# Altium integrated library Weidmueller_OMNIMATE_Signal.IntLib: 2550 symbols (part 17 of 45)
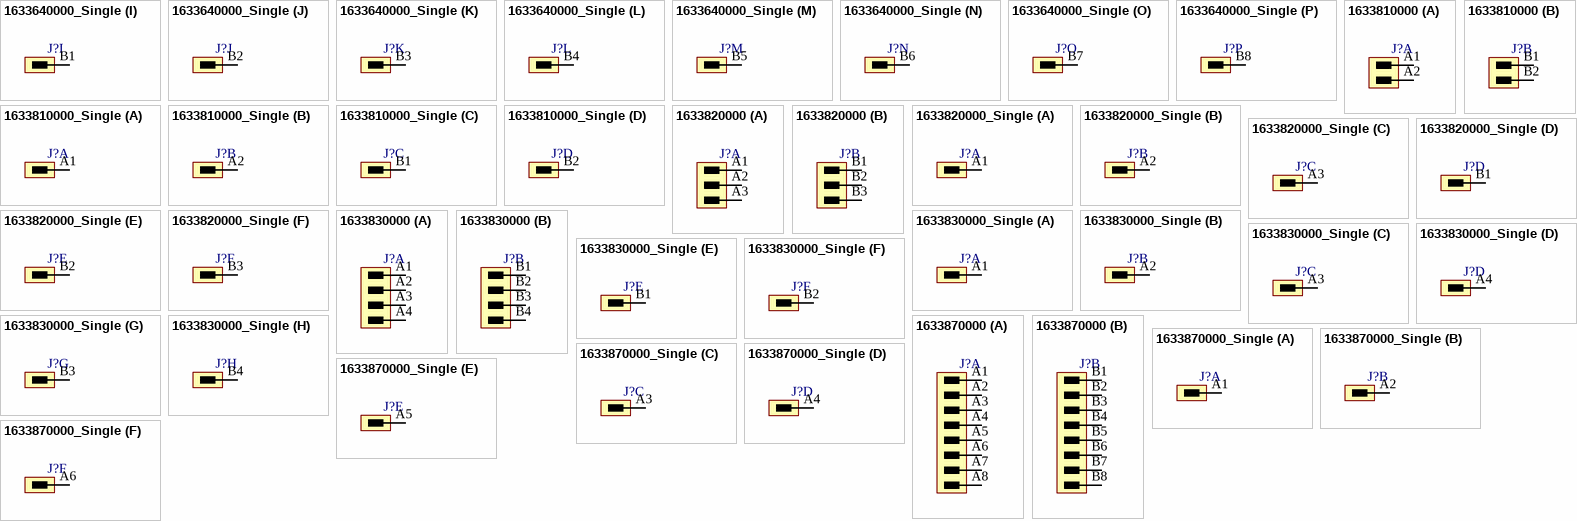
[diagram p227: symbols 1633640000_Single to 1633870000_Single]

## 1633820000_Single
designator J?
OMNIMATE Signal - series BL/SL 3.50; PartNumber: 1633820000; Manufacturer: Weidmueller; Short_text_for_material: SLD 3.50/06/90F 3.2SN OR BX; Side_termination_characteristic: Flange; Mounting_onto_the_PCB: Solder connection; Pitch_mm: 3.5 mm; Pitch_inch: 0.138 inch; No_of_poles: 6; Outgoing_elbow: 90°; Solder_pin_length_mm: 3.2 mm; Contact_material: CuSn; Contact_surface: tinned; Insulating_material: PBT; UL_94_flammability_rating: V-0; Rated_voltage_for_surge_voltage_class_pollution_degree_II_2: 200 V; Rated_current_min_no_of_poles_TU_20_deg_C: 32 A; Rated_voltage_use_group_B_UL_1059: 300 V; Rated_current_use_group_B_UL_1059: 8 A; PackageReference: SLD_3_50_90F_06; Colour: Orange; Packaging: Box; Qty: 50 PCS; Revision: V1; ComponentLink1Description: Manufacturer URL; ComponentLink1URL: http://www.weidmueller.com/; ComponentLink2Description: URL Link1; ComponentLink2URL: http://catalog.weidmueller.com/catalog/Start.do?localeId=en&ObjectID=1633820000
footprint SLD_3_50_90F_06 (OMNIMATE Signal - Serie BL/SL 3.50  SLD 3.50/06/90F 3.2)
part A pins: A1
part B pins: A2
part C pins: A3
part D pins: B1
part E pins: B2
part F pins: B3

## 1633830000
designator J?
OMNIMATE Signal - series BL/SL 3.50; PartNumber: 1633830000; Manufacturer: Weidmueller; Short_text_for_material: SLD 3.50/08/90F 3.2SN OR BX; Side_termination_characteristic: Flange; Mounting_onto_the_PCB: Solder connection; Pitch_mm: 3.5 mm; Pitch_inch: 0.138 inch; No_of_poles: 8; Outgoing_elbow: 90°; Solder_pin_length_mm: 3.2 mm; Contact_material: CuSn; Contact_surface: tinned; Insulating_material: PBT; UL_94_flammability_rating: V-0; Rated_voltage_for_surge_voltage_class_pollution_degree_II_2: 200 V; Rated_current_min_no_of_poles_TU_20_deg_C: 32 A; Rated_voltage_use_group_B_UL_1059: 300 V; Rated_current_use_group_B_UL_1059: 8 A; PackageReference: SLD_3_50_90F_08; Colour: Orange; Packaging: Box; Qty: 50 PCS; Revision: V1; ComponentLink1Description: Manufacturer URL; ComponentLink1URL: http://www.weidmueller.com/; ComponentLink2Description: URL Link1; ComponentLink2URL: http://catalog.weidmueller.com/catalog/Start.do?localeId=en&ObjectID=1633830000
footprint SLD_3_50_90F_08 (OMNIMATE Signal - Serie BL/SL 3.50  SLD 3.50/08/90F 3.2)
part A pins: A1, A2, A3, A4
part B pins: B1, B2, B3, B4

## 1633830000_Single
designator J?
OMNIMATE Signal - series BL/SL 3.50; PartNumber: 1633830000; Manufacturer: Weidmueller; Short_text_for_material: SLD 3.50/08/90F 3.2SN OR BX; Side_termination_characteristic: Flange; Mounting_onto_the_PCB: Solder connection; Pitch_mm: 3.5 mm; Pitch_inch: 0.138 inch; No_of_poles: 8; Outgoing_elbow: 90°; Solder_pin_length_mm: 3.2 mm; Contact_material: CuSn; Contact_surface: tinned; Insulating_material: PBT; UL_94_flammability_rating: V-0; Rated_voltage_for_surge_voltage_class_pollution_degree_II_2: 200 V; Rated_current_min_no_of_poles_TU_20_deg_C: 32 A; Rated_voltage_use_group_B_UL_1059: 300 V; Rated_current_use_group_B_UL_1059: 8 A; PackageReference: SLD_3_50_90F_08; Colour: Orange; Packaging: Box; Qty: 50 PCS; Revision: V1; ComponentLink1Description: Manufacturer URL; ComponentLink1URL: http://www.weidmueller.com/; ComponentLink2Description: URL Link1; ComponentLink2URL: http://catalog.weidmueller.com/catalog/Start.do?localeId=en&ObjectID=1633830000
footprint SLD_3_50_90F_08 (OMNIMATE Signal - Serie BL/SL 3.50  SLD 3.50/08/90F 3.2)
part A pins: A1
part B pins: A2
part C pins: A3
part D pins: A4
part E pins: B1
part F pins: B2
part G pins: B3
part H pins: B4

## 1633870000
designator J?
OMNIMATE Signal - series BL/SL 3.50; PartNumber: 1633870000; Manufacturer: Weidmueller; Short_text_for_material: SLD 3.50/16/90F 3.2SN OR BX; Side_termination_characteristic: Flange; Mounting_onto_the_PCB: Solder connection; Pitch_mm: 3.5 mm; Pitch_inch: 0.138 inch; No_of_poles: 16; Outgoing_elbow: 90°; Solder_pin_length_mm: 3.2 mm; Contact_material: CuSn; Contact_surface: tinned; Insulating_material: PBT; UL_94_flammability_rating: V-0; Rated_voltage_for_surge_voltage_class_pollution_degree_II_2: 200 V; Rated_current_min_no_of_poles_TU_20_deg_C: 32 A; Rated_voltage_use_group_B_UL_1059: 300 V; Rated_current_use_group_B_UL_1059: 8 A; PackageReference: SLD_3_50_90F_16; Colour: Orange; Packaging: Box; Qty: 20 PCS; Revision: V1; ComponentLink1Description: Manufacturer URL; ComponentLink1URL: http://www.weidmueller.com/; ComponentLink2Description: URL Link1; ComponentLink2URL: http://catalog.weidmueller.com/catalog/Start.do?localeId=en&ObjectID=1633870000
footprint SLD_3_50_90F_16 (OMNIMATE Signal - Serie BL/SL 3.50  SLD 3.50/16/90F 3.2)
part A pins: A1, A2, A3, A4, A5, A6, A7, A8
part B pins: B1, B2, B3, B4, B5, B6, B7, B8

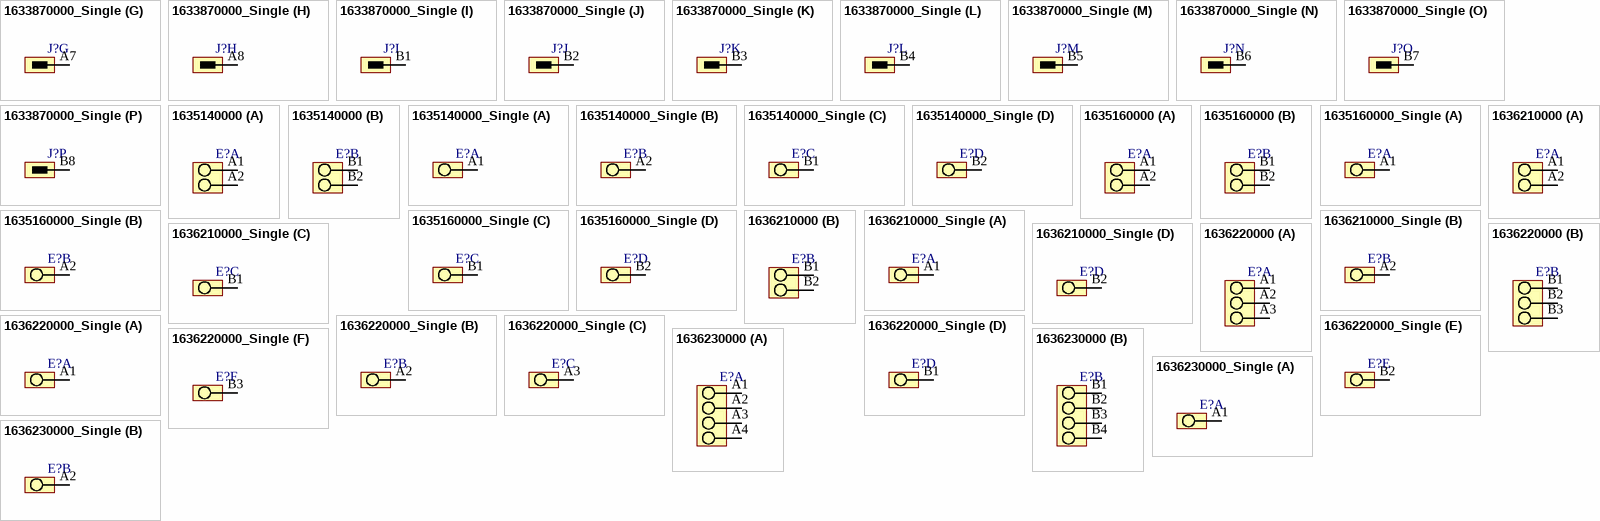
[diagram p92: symbols 1633870000_Single to 1636230000_Single]

## 1633870000_Single
designator J?
OMNIMATE Signal - series BL/SL 3.50; PartNumber: 1633870000; Manufacturer: Weidmueller; Short_text_for_material: SLD 3.50/16/90F 3.2SN OR BX; Side_termination_characteristic: Flange; Mounting_onto_the_PCB: Solder connection; Pitch_mm: 3.5 mm; Pitch_inch: 0.138 inch; No_of_poles: 16; Outgoing_elbow: 90°; Solder_pin_length_mm: 3.2 mm; Contact_material: CuSn; Contact_surface: tinned; Insulating_material: PBT; UL_94_flammability_rating: V-0; Rated_voltage_for_surge_voltage_class_pollution_degree_II_2: 200 V; Rated_current_min_no_of_poles_TU_20_deg_C: 32 A; Rated_voltage_use_group_B_UL_1059: 300 V; Rated_current_use_group_B_UL_1059: 8 A; PackageReference: SLD_3_50_90F_16; Colour: Orange; Packaging: Box; Qty: 20 PCS; Revision: V1; ComponentLink1Description: Manufacturer URL; ComponentLink1URL: http://www.weidmueller.com/; ComponentLink2Description: URL Link1; ComponentLink2URL: http://catalog.weidmueller.com/catalog/Start.do?localeId=en&ObjectID=1633870000
footprint SLD_3_50_90F_16 (OMNIMATE Signal - Serie BL/SL 3.50  SLD 3.50/16/90F 3.2)
part A pins: A1
part B pins: A2
part C pins: A3
part D pins: A4
part E pins: A5
part F pins: A6
part G pins: A7
part H pins: A8
part I pins: B1
part J pins: B2
part K pins: B3
part L pins: B4
part M pins: B5
part N pins: B6
part O pins: B7
part P pins: B8

## 1635140000
designator E?
OMNIMATE Signal - series LP; PartNumber: 1635140000; Manufacturer: Weidmueller; Short_text_for_material: LP2N 5.08/04/90 3.2SN OR BX; Side_termination_characteristic: closed side; Mounting_onto_the_PCB: Solder connection; Pitch_mm: 5,08 mm; Pitch_inch: 0,2 inch; No_of_poles: 4; Solder_pin_length_mm: 3,2 mm; Contact_material: Cu-Leg; Contact_surface: tinned; Insulating_material: PA; UL_94_flammability_rating: V-2; Rated_voltage_for_surge_voltage_class_pollution_degree_II_2: 500 V; Rated_current_min_no_of_poles_TU_20_deg_C: 32 A; Solid_min_H05_07_V_U: 0,5 mm²; Solid_max_H05_07_V_U: 6 mm²; Rated_voltage_use_group_B_UL_1059: 300 V; Rated_current_use_group_B_UL_1059: 20 A; Wire_cross_section_AWG_min_UL_1059: AWG 26; Wire_cross_section_AWG_max_UL_1059: AWG 12; PackageReference: LP2N_5_08_04; Colour: Orange; Packaging: Box; Qty: 50 PCS; Revision: V1; ComponentLink1Description: Manufacturer URL; ComponentLink1URL: http://www.weidmueller.com/; ComponentLink2Description: URL Link1; ComponentLink2URL: http://catalog.weidmueller.com/catalog/Start.do?localeId=en&ObjectID=1635140000
footprint LP2N_5_08_04 (OMNIMATE Signal - Serie LP  LP2N 5.08/04/90 3.2)
part A pins: A1, A2
part B pins: B1, B2
1 alternate drawing of the same symbol

## 1635140000_Single
designator E?
OMNIMATE Signal - series LP; PartNumber: 1635140000; Manufacturer: Weidmueller; Short_text_for_material: LP2N 5.08/04/90 3.2SN OR BX; Side_termination_characteristic: closed side; Mounting_onto_the_PCB: Solder connection; Pitch_mm: 5,08 mm; Pitch_inch: 0,2 inch; No_of_poles: 4; Solder_pin_length_mm: 3,2 mm; Contact_material: Cu-Leg; Contact_surface: tinned; Insulating_material: PA; UL_94_flammability_rating: V-2; Rated_voltage_for_surge_voltage_class_pollution_degree_II_2: 500 V; Rated_current_min_no_of_poles_TU_20_deg_C: 32 A; Solid_min_H05_07_V_U: 0,5 mm²; Solid_max_H05_07_V_U: 6 mm²; Rated_voltage_use_group_B_UL_1059: 300 V; Rated_current_use_group_B_UL_1059: 20 A; Wire_cross_section_AWG_min_UL_1059: AWG 26; Wire_cross_section_AWG_max_UL_1059: AWG 12; PackageReference: LP2N_5_08_04; Colour: Orange; Packaging: Box; Qty: 50 PCS; Revision: V1; ComponentLink1Description: Manufacturer URL; ComponentLink1URL: http://www.weidmueller.com/; ComponentLink2Description: URL Link1; ComponentLink2URL: http://catalog.weidmueller.com/catalog/Start.do?localeId=en&ObjectID=1635140000
footprint LP2N_5_08_04 (OMNIMATE Signal - Serie LP  LP2N 5.08/04/90 3.2)
part A pins: A1
part B pins: A2
part C pins: B1
part D pins: B2
1 alternate drawing of the same symbol

## 1635160000
designator E?
OMNIMATE Signal - series LP; PartNumber: 1635160000; Manufacturer: Weidmueller; Short_text_for_material: LP2N 5.00/04/90 3.2SN OR BX; Side_termination_characteristic: closed side; Mounting_onto_the_PCB: Solder connection; Pitch_mm: 5 mm; Pitch_inch: 0,197 inch; No_of_poles: 4; Solder_pin_length_mm: 3,2 mm; Contact_material: Cu-Leg; Contact_surface: tinned; Insulating_material: PA; UL_94_flammability_rating: V-2; Rated_voltage_for_surge_voltage_class_pollution_degree_II_2: 500 V; Rated_current_min_no_of_poles_TU_20_deg_C: 32 A; Solid_min_H05_07_V_U: 0,5 mm²; Solid_max_H05_07_V_U: 6 mm²; Rated_voltage_use_group_B_UL_1059: 300 V; Rated_current_use_group_B_UL_1059: 20 A; Wire_cross_section_AWG_min_UL_1059: AWG 26; Wire_cross_section_AWG_max_UL_1059: AWG 12; PackageReference: LP2N_5_00_04; Colour: Orange; Packaging: Box; Qty: 50 PCS; Revision: V1; ComponentLink1Description: Manufacturer URL; ComponentLink1URL: http://www.weidmueller.com/; ComponentLink2Description: URL Link1; ComponentLink2URL: http://catalog.weidmueller.com/catalog/Start.do?localeId=en&ObjectID=1635160000
footprint LP2N_5_00_04 (OMNIMATE Signal - Serie LP  LP2N 5.00/04/90 3.2)
part A pins: A1, A2
part B pins: B1, B2
1 alternate drawing of the same symbol

## 1635160000_Single
designator E?
OMNIMATE Signal - series LP; PartNumber: 1635160000; Manufacturer: Weidmueller; Short_text_for_material: LP2N 5.00/04/90 3.2SN OR BX; Side_termination_characteristic: closed side; Mounting_onto_the_PCB: Solder connection; Pitch_mm: 5 mm; Pitch_inch: 0,197 inch; No_of_poles: 4; Solder_pin_length_mm: 3,2 mm; Contact_material: Cu-Leg; Contact_surface: tinned; Insulating_material: PA; UL_94_flammability_rating: V-2; Rated_voltage_for_surge_voltage_class_pollution_degree_II_2: 500 V; Rated_current_min_no_of_poles_TU_20_deg_C: 32 A; Solid_min_H05_07_V_U: 0,5 mm²; Solid_max_H05_07_V_U: 6 mm²; Rated_voltage_use_group_B_UL_1059: 300 V; Rated_current_use_group_B_UL_1059: 20 A; Wire_cross_section_AWG_min_UL_1059: AWG 26; Wire_cross_section_AWG_max_UL_1059: AWG 12; PackageReference: LP2N_5_00_04; Colour: Orange; Packaging: Box; Qty: 50 PCS; Revision: V1; ComponentLink1Description: Manufacturer URL; ComponentLink1URL: http://www.weidmueller.com/; ComponentLink2Description: URL Link1; ComponentLink2URL: http://catalog.weidmueller.com/catalog/Start.do?localeId=en&ObjectID=1635160000
footprint LP2N_5_00_04 (OMNIMATE Signal - Serie LP  LP2N 5.00/04/90 3.2)
part A pins: A1
part B pins: A2
part C pins: B1
part D pins: B2
1 alternate drawing of the same symbol

## 1636210000
designator E?
OMNIMATE Signal - series LP; PartNumber: 1636210000; Manufacturer: Weidmueller; Short_text_for_material: LP2HR 5.08/04/90 3.2SN OR BX; Side_termination_characteristic: closed side; Mounting_onto_the_PCB: Solder connection; Pitch_mm: 5,08 mm; Pitch_inch: 0,2 inch; No_of_poles: 4; Solder_pin_length_mm: 3,2 mm; Contact_material: Cu-Leg; Contact_surface: tinned; Insulating_material: PA; UL_94_flammability_rating: V-2; Rated_voltage_for_surge_voltage_class_pollution_degree_II_2: 500 V; Rated_current_min_no_of_poles_TU_20_deg_C: 32 A; Solid_min_H05_07_V_U: 0,5 mm²; Solid_max_H05_07_V_U: 6 mm²; Rated_voltage_use_group_B_UL_1059: 300 V; Rated_current_use_group_B_UL_1059: 20 A; Wire_cross_section_AWG_min_UL_1059: AWG 26; Wire_cross_section_AWG_max_UL_1059: AWG 12; PackageReference: LP2HR_5_08_04; Colour: Orange; Packaging: Box; Qty: 50 PCS; Revision: V1; ComponentLink1Description: Manufacturer URL; ComponentLink1URL: http://www.weidmueller.com/; ComponentLink2Description: URL Link1; ComponentLink2URL: http://catalog.weidmueller.com/catalog/Start.do?localeId=en&ObjectID=1636210000
footprint LP2HR_5_08_04 (OMNIMATE Signal - Serie LP  LP2HR 5.08/04/90 3.2)
part A pins: A1, A2
part B pins: B1, B2
1 alternate drawing of the same symbol

## 1636210000_Single
designator E?
OMNIMATE Signal - series LP; PartNumber: 1636210000; Manufacturer: Weidmueller; Short_text_for_material: LP2HR 5.08/04/90 3.2SN OR BX; Side_termination_characteristic: closed side; Mounting_onto_the_PCB: Solder connection; Pitch_mm: 5,08 mm; Pitch_inch: 0,2 inch; No_of_poles: 4; Solder_pin_length_mm: 3,2 mm; Contact_material: Cu-Leg; Contact_surface: tinned; Insulating_material: PA; UL_94_flammability_rating: V-2; Rated_voltage_for_surge_voltage_class_pollution_degree_II_2: 500 V; Rated_current_min_no_of_poles_TU_20_deg_C: 32 A; Solid_min_H05_07_V_U: 0,5 mm²; Solid_max_H05_07_V_U: 6 mm²; Rated_voltage_use_group_B_UL_1059: 300 V; Rated_current_use_group_B_UL_1059: 20 A; Wire_cross_section_AWG_min_UL_1059: AWG 26; Wire_cross_section_AWG_max_UL_1059: AWG 12; PackageReference: LP2HR_5_08_04; Colour: Orange; Packaging: Box; Qty: 50 PCS; Revision: V1; ComponentLink1Description: Manufacturer URL; ComponentLink1URL: http://www.weidmueller.com/; ComponentLink2Description: URL Link1; ComponentLink2URL: http://catalog.weidmueller.com/catalog/Start.do?localeId=en&ObjectID=1636210000
footprint LP2HR_5_08_04 (OMNIMATE Signal - Serie LP  LP2HR 5.08/04/90 3.2)
part A pins: A1
part B pins: A2
part C pins: B1
part D pins: B2
1 alternate drawing of the same symbol

## 1636220000
designator E?
OMNIMATE Signal - series LP; PartNumber: 1636220000; Manufacturer: Weidmueller; Short_text_for_material: LP2HR 5.08/06/90 3.2SN OR BX; Side_termination_characteristic: closed side; Mounting_onto_the_PCB: Solder connection; Pitch_mm: 5,08 mm; Pitch_inch: 0,2 inch; No_of_poles: 6; Solder_pin_length_mm: 3,2 mm; Contact_material: Cu-Leg; Contact_surface: tinned; Insulating_material: PA; UL_94_flammability_rating: V-2; Rated_voltage_for_surge_voltage_class_pollution_degree_II_2: 500 V; Rated_current_min_no_of_poles_TU_20_deg_C: 32 A; Solid_min_H05_07_V_U: 0,5 mm²; Solid_max_H05_07_V_U: 6 mm²; Rated_voltage_use_group_B_UL_1059: 300 V; Rated_current_use_group_B_UL_1059: 20 A; Wire_cross_section_AWG_min_UL_1059: AWG 26; Wire_cross_section_AWG_max_UL_1059: AWG 12; PackageReference: LP2HR_5_08_06; Colour: Orange; Packaging: Box; Qty: 50 PCS; Revision: V1; ComponentLink1Description: Manufacturer URL; ComponentLink1URL: http://www.weidmueller.com/; ComponentLink2Description: URL Link1; ComponentLink2URL: http://catalog.weidmueller.com/catalog/Start.do?localeId=en&ObjectID=1636220000
footprint LP2HR_5_08_06 (OMNIMATE Signal - Serie LP  LP2HR 5.08/06/90 3.2)
part A pins: A1, A2, A3
part B pins: B1, B2, B3
1 alternate drawing of the same symbol

## 1636220000_Single
designator E?
OMNIMATE Signal - series LP; PartNumber: 1636220000; Manufacturer: Weidmueller; Short_text_for_material: LP2HR 5.08/06/90 3.2SN OR BX; Side_termination_characteristic: closed side; Mounting_onto_the_PCB: Solder connection; Pitch_mm: 5,08 mm; Pitch_inch: 0,2 inch; No_of_poles: 6; Solder_pin_length_mm: 3,2 mm; Contact_material: Cu-Leg; Contact_surface: tinned; Insulating_material: PA; UL_94_flammability_rating: V-2; Rated_voltage_for_surge_voltage_class_pollution_degree_II_2: 500 V; Rated_current_min_no_of_poles_TU_20_deg_C: 32 A; Solid_min_H05_07_V_U: 0,5 mm²; Solid_max_H05_07_V_U: 6 mm²; Rated_voltage_use_group_B_UL_1059: 300 V; Rated_current_use_group_B_UL_1059: 20 A; Wire_cross_section_AWG_min_UL_1059: AWG 26; Wire_cross_section_AWG_max_UL_1059: AWG 12; PackageReference: LP2HR_5_08_06; Colour: Orange; Packaging: Box; Qty: 50 PCS; Revision: V1; ComponentLink1Description: Manufacturer URL; ComponentLink1URL: http://www.weidmueller.com/; ComponentLink2Description: URL Link1; ComponentLink2URL: http://catalog.weidmueller.com/catalog/Start.do?localeId=en&ObjectID=1636220000
footprint LP2HR_5_08_06 (OMNIMATE Signal - Serie LP  LP2HR 5.08/06/90 3.2)
part A pins: A1
part B pins: A2
part C pins: A3
part D pins: B1
part E pins: B2
part F pins: B3
1 alternate drawing of the same symbol

## 1636230000
designator E?
OMNIMATE Signal - series LP; PartNumber: 1636230000; Manufacturer: Weidmueller; Short_text_for_material: LP2HR 5.08/08/90 3.2SN OR BX; Side_termination_characteristic: closed side; Mounting_onto_the_PCB: Solder connection; Pitch_mm: 5,08 mm; Pitch_inch: 0,2 inch; No_of_poles: 8; Solder_pin_length_mm: 3,2 mm; Contact_material: Cu-Leg; Contact_surface: tinned; Insulating_material: PA; UL_94_flammability_rating: V-2; Rated_voltage_for_surge_voltage_class_pollution_degree_II_2: 500 V; Rated_current_min_no_of_poles_TU_20_deg_C: 32 A; Solid_min_H05_07_V_U: 0,5 mm²; Solid_max_H05_07_V_U: 6 mm²; Rated_voltage_use_group_B_UL_1059: 300 V; Rated_current_use_group_B_UL_1059: 20 A; Wire_cross_section_AWG_min_UL_1059: AWG 26; Wire_cross_section_AWG_max_UL_1059: AWG 12; PackageReference: LP2HR_5_08_08; Colour: Orange; Packaging: Box; Qty: 50 PCS; Revision: V1; ComponentLink1Description: Manufacturer URL; ComponentLink1URL: http://www.weidmueller.com/; ComponentLink2Description: URL Link1; ComponentLink2URL: http://catalog.weidmueller.com/catalog/Start.do?localeId=en&ObjectID=1636230000
footprint LP2HR_5_08_08 (OMNIMATE Signal - Serie LP  LP2HR 5.08/08/90 3.2)
part A pins: A1, A2, A3, A4
part B pins: B1, B2, B3, B4
1 alternate drawing of the same symbol

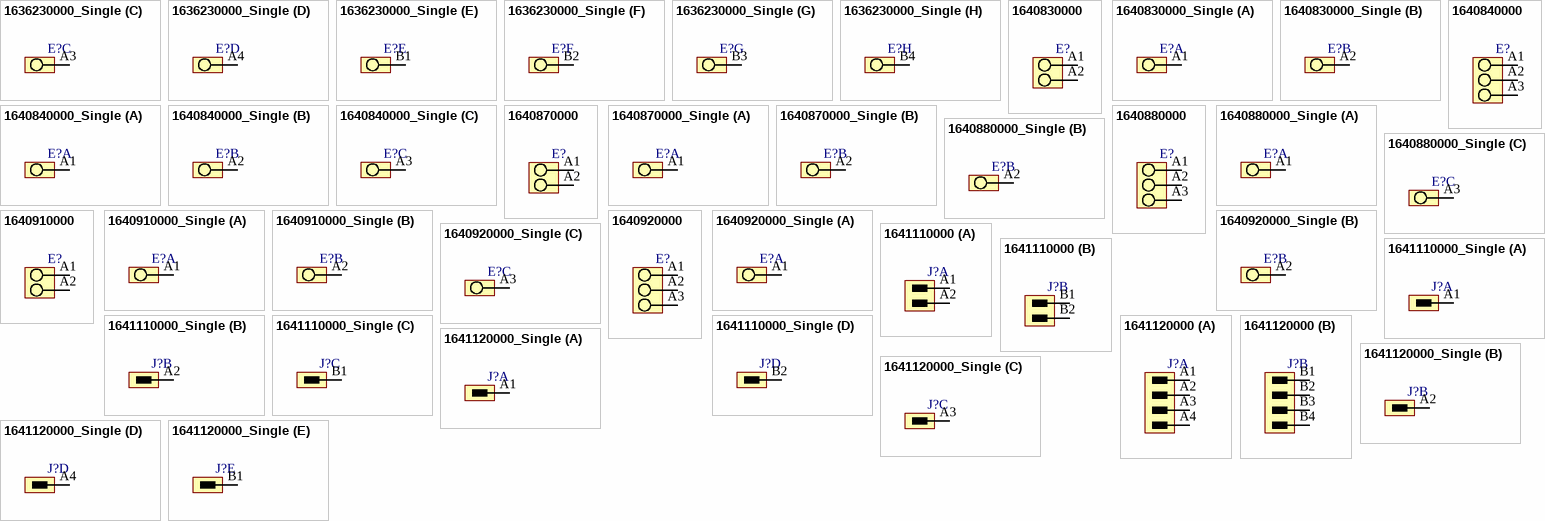
[diagram p93: symbols 1636230000_Single to 1641120000_Single]

## 1636230000_Single
designator E?
OMNIMATE Signal - series LP; PartNumber: 1636230000; Manufacturer: Weidmueller; Short_text_for_material: LP2HR 5.08/08/90 3.2SN OR BX; Side_termination_characteristic: closed side; Mounting_onto_the_PCB: Solder connection; Pitch_mm: 5,08 mm; Pitch_inch: 0,2 inch; No_of_poles: 8; Solder_pin_length_mm: 3,2 mm; Contact_material: Cu-Leg; Contact_surface: tinned; Insulating_material: PA; UL_94_flammability_rating: V-2; Rated_voltage_for_surge_voltage_class_pollution_degree_II_2: 500 V; Rated_current_min_no_of_poles_TU_20_deg_C: 32 A; Solid_min_H05_07_V_U: 0,5 mm²; Solid_max_H05_07_V_U: 6 mm²; Rated_voltage_use_group_B_UL_1059: 300 V; Rated_current_use_group_B_UL_1059: 20 A; Wire_cross_section_AWG_min_UL_1059: AWG 26; Wire_cross_section_AWG_max_UL_1059: AWG 12; PackageReference: LP2HR_5_08_08; Colour: Orange; Packaging: Box; Qty: 50 PCS; Revision: V1; ComponentLink1Description: Manufacturer URL; ComponentLink1URL: http://www.weidmueller.com/; ComponentLink2Description: URL Link1; ComponentLink2URL: http://catalog.weidmueller.com/catalog/Start.do?localeId=en&ObjectID=1636230000
footprint LP2HR_5_08_08 (OMNIMATE Signal - Serie LP  LP2HR 5.08/08/90 3.2)
part A pins: A1
part B pins: A2
part C pins: A3
part D pins: A4
part E pins: B1
part F pins: B2
part G pins: B3
part H pins: B4
1 alternate drawing of the same symbol

## 1640830000
designator E?
OMNIMATE Signal - series LP; PartNumber: 1640830000; Manufacturer: Weidmueller; Short_text_for_material: LP1N 5.08/02/90 3.2SN OR BX; Side_termination_characteristic: closed side; Mounting_onto_the_PCB: Solder connection; Pitch_mm: 5,08 mm; Pitch_inch: 0,2 inch; No_of_poles: 2; Solder_pin_length_mm: 3,2 mm; Contact_material: Cu-Leg; Contact_surface: tinned; Insulating_material: PA; UL_94_flammability_rating: V-2; Rated_voltage_for_surge_voltage_class_pollution_degree_II_2: 500 V; Rated_current_min_no_of_poles_TU_20_deg_C: 32 A; Solid_min_H05_07_V_U: 0,5 mm²; Solid_max_H05_07_V_U: 6 mm²; Rated_voltage_use_group_B_UL_1059: 300 V; Rated_current_use_group_B_UL_1059: 20 A; Wire_cross_section_AWG_min_UL_1059: AWG 26; Wire_cross_section_AWG_max_UL_1059: AWG 12; PackageReference: LP1N_5_08_02; Colour: Orange; Packaging: Box; Qty: 100 PCS; Revision: V1; ComponentLink1Description: Manufacturer URL; ComponentLink1URL: http://www.weidmueller.com/; ComponentLink2Description: URL Link1; ComponentLink2URL: http://catalog.weidmueller.com/catalog/Start.do?localeId=en&ObjectID=1640830000
footprint LP1N_5_08_02 (OMNIMATE Signal - Serie LP  LP1N 5.08/02/90 3.2)
pins: A1, A2
1 alternate drawing of the same symbol

## 1640830000_Single
designator E?
OMNIMATE Signal - series LP; PartNumber: 1640830000; Manufacturer: Weidmueller; Short_text_for_material: LP1N 5.08/02/90 3.2SN OR BX; Side_termination_characteristic: closed side; Mounting_onto_the_PCB: Solder connection; Pitch_mm: 5,08 mm; Pitch_inch: 0,2 inch; No_of_poles: 2; Solder_pin_length_mm: 3,2 mm; Contact_material: Cu-Leg; Contact_surface: tinned; Insulating_material: PA; UL_94_flammability_rating: V-2; Rated_voltage_for_surge_voltage_class_pollution_degree_II_2: 500 V; Rated_current_min_no_of_poles_TU_20_deg_C: 32 A; Solid_min_H05_07_V_U: 0,5 mm²; Solid_max_H05_07_V_U: 6 mm²; Rated_voltage_use_group_B_UL_1059: 300 V; Rated_current_use_group_B_UL_1059: 20 A; Wire_cross_section_AWG_min_UL_1059: AWG 26; Wire_cross_section_AWG_max_UL_1059: AWG 12; PackageReference: LP1N_5_08_02; Colour: Orange; Packaging: Box; Qty: 100 PCS; Revision: V1; ComponentLink1Description: Manufacturer URL; ComponentLink1URL: http://www.weidmueller.com/; ComponentLink2Description: URL Link1; ComponentLink2URL: http://catalog.weidmueller.com/catalog/Start.do?localeId=en&ObjectID=1640830000
footprint LP1N_5_08_02 (OMNIMATE Signal - Serie LP  LP1N 5.08/02/90 3.2)
part A pins: A1
part B pins: A2
1 alternate drawing of the same symbol

## 1640840000
designator E?
OMNIMATE Signal - series LP; PartNumber: 1640840000; Manufacturer: Weidmueller; Short_text_for_material: LP1N 5.08/03/90 3.2SN OR BX; Side_termination_characteristic: closed side; Mounting_onto_the_PCB: Solder connection; Pitch_mm: 5,08 mm; Pitch_inch: 0,2 inch; No_of_poles: 3; Solder_pin_length_mm: 3,2 mm; Contact_material: Cu-Leg; Contact_surface: tinned; Insulating_material: PA; UL_94_flammability_rating: V-2; Rated_voltage_for_surge_voltage_class_pollution_degree_II_2: 500 V; Rated_current_min_no_of_poles_TU_20_deg_C: 32 A; Solid_min_H05_07_V_U: 0,5 mm²; Solid_max_H05_07_V_U: 6 mm²; Rated_voltage_use_group_B_UL_1059: 300 V; Rated_current_use_group_B_UL_1059: 20 A; Wire_cross_section_AWG_min_UL_1059: AWG 26; Wire_cross_section_AWG_max_UL_1059: AWG 12; PackageReference: LP1N_5_08_03; Colour: Orange; Packaging: Box; Qty: 100 PCS; Revision: V1; ComponentLink1Description: Manufacturer URL; ComponentLink1URL: http://www.weidmueller.com/; ComponentLink2Description: URL Link1; ComponentLink2URL: http://catalog.weidmueller.com/catalog/Start.do?localeId=en&ObjectID=1640840000
footprint LP1N_5_08_03 (OMNIMATE Signal - Serie LP  LP1N 5.08/03/90 3.2)
pins: A1, A2, A3
1 alternate drawing of the same symbol

## 1640840000_Single
designator E?
OMNIMATE Signal - series LP; PartNumber: 1640840000; Manufacturer: Weidmueller; Short_text_for_material: LP1N 5.08/03/90 3.2SN OR BX; Side_termination_characteristic: closed side; Mounting_onto_the_PCB: Solder connection; Pitch_mm: 5,08 mm; Pitch_inch: 0,2 inch; No_of_poles: 3; Solder_pin_length_mm: 3,2 mm; Contact_material: Cu-Leg; Contact_surface: tinned; Insulating_material: PA; UL_94_flammability_rating: V-2; Rated_voltage_for_surge_voltage_class_pollution_degree_II_2: 500 V; Rated_current_min_no_of_poles_TU_20_deg_C: 32 A; Solid_min_H05_07_V_U: 0,5 mm²; Solid_max_H05_07_V_U: 6 mm²; Rated_voltage_use_group_B_UL_1059: 300 V; Rated_current_use_group_B_UL_1059: 20 A; Wire_cross_section_AWG_min_UL_1059: AWG 26; Wire_cross_section_AWG_max_UL_1059: AWG 12; PackageReference: LP1N_5_08_03; Colour: Orange; Packaging: Box; Qty: 100 PCS; Revision: V1; ComponentLink1Description: Manufacturer URL; ComponentLink1URL: http://www.weidmueller.com/; ComponentLink2Description: URL Link1; ComponentLink2URL: http://catalog.weidmueller.com/catalog/Start.do?localeId=en&ObjectID=1640840000
footprint LP1N_5_08_03 (OMNIMATE Signal - Serie LP  LP1N 5.08/03/90 3.2)
part A pins: A1
part B pins: A2
part C pins: A3
1 alternate drawing of the same symbol

## 1640870000
designator E?
OMNIMATE Signal - series LP; PartNumber: 1640870000; Manufacturer: Weidmueller; Short_text_for_material: LP1N 5.00/02/90 3.2SN OR BX; Side_termination_characteristic: closed side; Mounting_onto_the_PCB: Solder connection; Pitch_mm: 5 mm; Pitch_inch: 0,197 inch; No_of_poles: 2; Solder_pin_length_mm: 3,2 mm; Contact_material: Cu-Leg; Contact_surface: tinned; Insulating_material: PA; UL_94_flammability_rating: V-2; Rated_voltage_for_surge_voltage_class_pollution_degree_II_2: 500 V; Rated_current_min_no_of_poles_TU_20_deg_C: 32 A; Solid_min_H05_07_V_U: 0,5 mm²; Solid_max_H05_07_V_U: 6 mm²; Rated_voltage_use_group_B_UL_1059: 300 V; Rated_current_use_group_B_UL_1059: 20 A; Wire_cross_section_AWG_min_UL_1059: AWG 26; Wire_cross_section_AWG_max_UL_1059: AWG 12; PackageReference: LP1N_5_00_02; Colour: Orange; Packaging: Box; Qty: 100 PCS; Revision: V1; ComponentLink1Description: Manufacturer URL; ComponentLink1URL: http://www.weidmueller.com/; ComponentLink2Description: URL Link1; ComponentLink2URL: http://catalog.weidmueller.com/catalog/Start.do?localeId=en&ObjectID=1640870000
footprint LP1N_5_00_02 (OMNIMATE Signal - Serie LP  LP1N 5.00/02/90 3.2)
pins: A1, A2
1 alternate drawing of the same symbol

## 1640870000_Single
designator E?
OMNIMATE Signal - series LP; PartNumber: 1640870000; Manufacturer: Weidmueller; Short_text_for_material: LP1N 5.00/02/90 3.2SN OR BX; Side_termination_characteristic: closed side; Mounting_onto_the_PCB: Solder connection; Pitch_mm: 5 mm; Pitch_inch: 0,197 inch; No_of_poles: 2; Solder_pin_length_mm: 3,2 mm; Contact_material: Cu-Leg; Contact_surface: tinned; Insulating_material: PA; UL_94_flammability_rating: V-2; Rated_voltage_for_surge_voltage_class_pollution_degree_II_2: 500 V; Rated_current_min_no_of_poles_TU_20_deg_C: 32 A; Solid_min_H05_07_V_U: 0,5 mm²; Solid_max_H05_07_V_U: 6 mm²; Rated_voltage_use_group_B_UL_1059: 300 V; Rated_current_use_group_B_UL_1059: 20 A; Wire_cross_section_AWG_min_UL_1059: AWG 26; Wire_cross_section_AWG_max_UL_1059: AWG 12; PackageReference: LP1N_5_00_02; Colour: Orange; Packaging: Box; Qty: 100 PCS; Revision: V1; ComponentLink1Description: Manufacturer URL; ComponentLink1URL: http://www.weidmueller.com/; ComponentLink2Description: URL Link1; ComponentLink2URL: http://catalog.weidmueller.com/catalog/Start.do?localeId=en&ObjectID=1640870000
footprint LP1N_5_00_02 (OMNIMATE Signal - Serie LP  LP1N 5.00/02/90 3.2)
part A pins: A1
part B pins: A2
1 alternate drawing of the same symbol

## 1640880000
designator E?
OMNIMATE Signal - series LP; PartNumber: 1640880000; Manufacturer: Weidmueller; Short_text_for_material: LP1N 5.00/03/90 3.2SN OR BX; Side_termination_characteristic: closed side; Mounting_onto_the_PCB: Solder connection; Pitch_mm: 5 mm; Pitch_inch: 0,197 inch; No_of_poles: 3; Solder_pin_length_mm: 3,2 mm; Contact_material: Cu-Leg; Contact_surface: tinned; Insulating_material: PA; UL_94_flammability_rating: V-2; Rated_voltage_for_surge_voltage_class_pollution_degree_II_2: 500 V; Rated_current_min_no_of_poles_TU_20_deg_C: 32 A; Solid_min_H05_07_V_U: 0,5 mm²; Solid_max_H05_07_V_U: 6 mm²; Rated_voltage_use_group_B_UL_1059: 300 V; Rated_current_use_group_B_UL_1059: 20 A; Wire_cross_section_AWG_min_UL_1059: AWG 26; Wire_cross_section_AWG_max_UL_1059: AWG 12; PackageReference: LP1N_5_00_03; Colour: Orange; Packaging: Box; Qty: 100 PCS; Revision: V1; ComponentLink1Description: Manufacturer URL; ComponentLink1URL: http://www.weidmueller.com/; ComponentLink2Description: URL Link1; ComponentLink2URL: http://catalog.weidmueller.com/catalog/Start.do?localeId=en&ObjectID=1640880000
footprint LP1N_5_00_03 (OMNIMATE Signal - Serie LP  LP1N 5.00/03/90 3.2)
pins: A1, A2, A3
1 alternate drawing of the same symbol

## 1640880000_Single
designator E?
OMNIMATE Signal - series LP; PartNumber: 1640880000; Manufacturer: Weidmueller; Short_text_for_material: LP1N 5.00/03/90 3.2SN OR BX; Side_termination_characteristic: closed side; Mounting_onto_the_PCB: Solder connection; Pitch_mm: 5 mm; Pitch_inch: 0,197 inch; No_of_poles: 3; Solder_pin_length_mm: 3,2 mm; Contact_material: Cu-Leg; Contact_surface: tinned; Insulating_material: PA; UL_94_flammability_rating: V-2; Rated_voltage_for_surge_voltage_class_pollution_degree_II_2: 500 V; Rated_current_min_no_of_poles_TU_20_deg_C: 32 A; Solid_min_H05_07_V_U: 0,5 mm²; Solid_max_H05_07_V_U: 6 mm²; Rated_voltage_use_group_B_UL_1059: 300 V; Rated_current_use_group_B_UL_1059: 20 A; Wire_cross_section_AWG_min_UL_1059: AWG 26; Wire_cross_section_AWG_max_UL_1059: AWG 12; PackageReference: LP1N_5_00_03; Colour: Orange; Packaging: Box; Qty: 100 PCS; Revision: V1; ComponentLink1Description: Manufacturer URL; ComponentLink1URL: http://www.weidmueller.com/; ComponentLink2Description: URL Link1; ComponentLink2URL: http://catalog.weidmueller.com/catalog/Start.do?localeId=en&ObjectID=1640880000
footprint LP1N_5_00_03 (OMNIMATE Signal - Serie LP  LP1N 5.00/03/90 3.2)
part A pins: A1
part B pins: A2
part C pins: A3
1 alternate drawing of the same symbol

## 1640910000
designator E?
OMNIMATE Signal - series LP; PartNumber: 1640910000; Manufacturer: Weidmueller; Short_text_for_material: LP1H 5.08/02/90 3.2SN OR BX; Side_termination_characteristic: closed side; Mounting_onto_the_PCB: Solder connection; Pitch_mm: 5,08 mm; Pitch_inch: 0,2 inch; No_of_poles: 2; Solder_pin_length_mm: 3,2 mm; Contact_material: Cu-Leg; Contact_surface: tinned; Insulating_material: PA; UL_94_flammability_rating: V-2; Rated_voltage_for_surge_voltage_class_pollution_degree_II_2: 500 V; Rated_current_min_no_of_poles_TU_20_deg_C: 32 A; Solid_min_H05_07_V_U: 0,5 mm²; Solid_max_H05_07_V_U: 6 mm²; Rated_voltage_use_group_B_UL_1059: 300 V; Rated_current_use_group_B_UL_1059: 20 A; Wire_cross_section_AWG_min_UL_1059: AWG 26; Wire_cross_section_AWG_max_UL_1059: AWG 12; PackageReference: LP1H_5_08_02; Colour: Orange; Packaging: Box; Qty: 100 PCS; Revision: V1; ComponentLink1Description: Manufacturer URL; ComponentLink1URL: http://www.weidmueller.com/; ComponentLink2Description: URL Link1; ComponentLink2URL: http://catalog.weidmueller.com/catalog/Start.do?localeId=en&ObjectID=1640910000
footprint LP1H_5_08_02 (OMNIMATE Signal - Serie LP  LP1H 5.08/02/90 3.2)
pins: A1, A2
1 alternate drawing of the same symbol

## 1640910000_Single
designator E?
OMNIMATE Signal - series LP; PartNumber: 1640910000; Manufacturer: Weidmueller; Short_text_for_material: LP1H 5.08/02/90 3.2SN OR BX; Side_termination_characteristic: closed side; Mounting_onto_the_PCB: Solder connection; Pitch_mm: 5,08 mm; Pitch_inch: 0,2 inch; No_of_poles: 2; Solder_pin_length_mm: 3,2 mm; Contact_material: Cu-Leg; Contact_surface: tinned; Insulating_material: PA; UL_94_flammability_rating: V-2; Rated_voltage_for_surge_voltage_class_pollution_degree_II_2: 500 V; Rated_current_min_no_of_poles_TU_20_deg_C: 32 A; Solid_min_H05_07_V_U: 0,5 mm²; Solid_max_H05_07_V_U: 6 mm²; Rated_voltage_use_group_B_UL_1059: 300 V; Rated_current_use_group_B_UL_1059: 20 A; Wire_cross_section_AWG_min_UL_1059: AWG 26; Wire_cross_section_AWG_max_UL_1059: AWG 12; PackageReference: LP1H_5_08_02; Colour: Orange; Packaging: Box; Qty: 100 PCS; Revision: V1; ComponentLink1Description: Manufacturer URL; ComponentLink1URL: http://www.weidmueller.com/; ComponentLink2Description: URL Link1; ComponentLink2URL: http://catalog.weidmueller.com/catalog/Start.do?localeId=en&ObjectID=1640910000
footprint LP1H_5_08_02 (OMNIMATE Signal - Serie LP  LP1H 5.08/02/90 3.2)
part A pins: A1
part B pins: A2
1 alternate drawing of the same symbol

## 1640920000
designator E?
OMNIMATE Signal - series LP; PartNumber: 1640920000; Manufacturer: Weidmueller; Short_text_for_material: LP1H 5.08/03/90 3.2SN OR BX; Side_termination_characteristic: closed side; Mounting_onto_the_PCB: Solder connection; Pitch_mm: 5,08 mm; Pitch_inch: 0,2 inch; No_of_poles: 3; Solder_pin_length_mm: 3,2 mm; Contact_material: Cu-Leg; Contact_surface: tinned; Insulating_material: PA; UL_94_flammability_rating: V-2; Rated_voltage_for_surge_voltage_class_pollution_degree_II_2: 500 V; Rated_current_min_no_of_poles_TU_20_deg_C: 32 A; Solid_min_H05_07_V_U: 0,5 mm²; Solid_max_H05_07_V_U: 6 mm²; Rated_voltage_use_group_B_UL_1059: 300 V; Rated_current_use_group_B_UL_1059: 20 A; Wire_cross_section_AWG_min_UL_1059: AWG 26; Wire_cross_section_AWG_max_UL_1059: AWG 12; PackageReference: LP1H_5_08_03; Colour: Orange; Packaging: Box; Qty: 100 PCS; Revision: V1; ComponentLink1Description: Manufacturer URL; ComponentLink1URL: http://www.weidmueller.com/; ComponentLink2Description: URL Link1; ComponentLink2URL: http://catalog.weidmueller.com/catalog/Start.do?localeId=en&ObjectID=1640920000
footprint LP1H_5_08_03 (OMNIMATE Signal - Serie LP  LP1H 5.08/03/90 3.2)
pins: A1, A2, A3
1 alternate drawing of the same symbol

## 1640920000_Single
designator E?
OMNIMATE Signal - series LP; PartNumber: 1640920000; Manufacturer: Weidmueller; Short_text_for_material: LP1H 5.08/03/90 3.2SN OR BX; Side_termination_characteristic: closed side; Mounting_onto_the_PCB: Solder connection; Pitch_mm: 5,08 mm; Pitch_inch: 0,2 inch; No_of_poles: 3; Solder_pin_length_mm: 3,2 mm; Contact_material: Cu-Leg; Contact_surface: tinned; Insulating_material: PA; UL_94_flammability_rating: V-2; Rated_voltage_for_surge_voltage_class_pollution_degree_II_2: 500 V; Rated_current_min_no_of_poles_TU_20_deg_C: 32 A; Solid_min_H05_07_V_U: 0,5 mm²; Solid_max_H05_07_V_U: 6 mm²; Rated_voltage_use_group_B_UL_1059: 300 V; Rated_current_use_group_B_UL_1059: 20 A; Wire_cross_section_AWG_min_UL_1059: AWG 26; Wire_cross_section_AWG_max_UL_1059: AWG 12; PackageReference: LP1H_5_08_03; Colour: Orange; Packaging: Box; Qty: 100 PCS; Revision: V1; ComponentLink1Description: Manufacturer URL; ComponentLink1URL: http://www.weidmueller.com/; ComponentLink2Description: URL Link1; ComponentLink2URL: http://catalog.weidmueller.com/catalog/Start.do?localeId=en&ObjectID=1640920000
footprint LP1H_5_08_03 (OMNIMATE Signal - Serie LP  LP1H 5.08/03/90 3.2)
part A pins: A1
part B pins: A2
part C pins: A3
1 alternate drawing of the same symbol

## 1641110000
designator J?